# Altium footprint library PTH-Footprint.PcbLib: 58 footprints (part 4 of 4)
Each footprint in its own frame and in the unit in brackets; x right, y up, seen from the top. Pads: shape width x height; smd on the part's side, far side on the other; paste and mask are expansions set on the pad; w line width, h text height; cw(c..) or ccw(c..) is an arc to the next point about the centre after c.
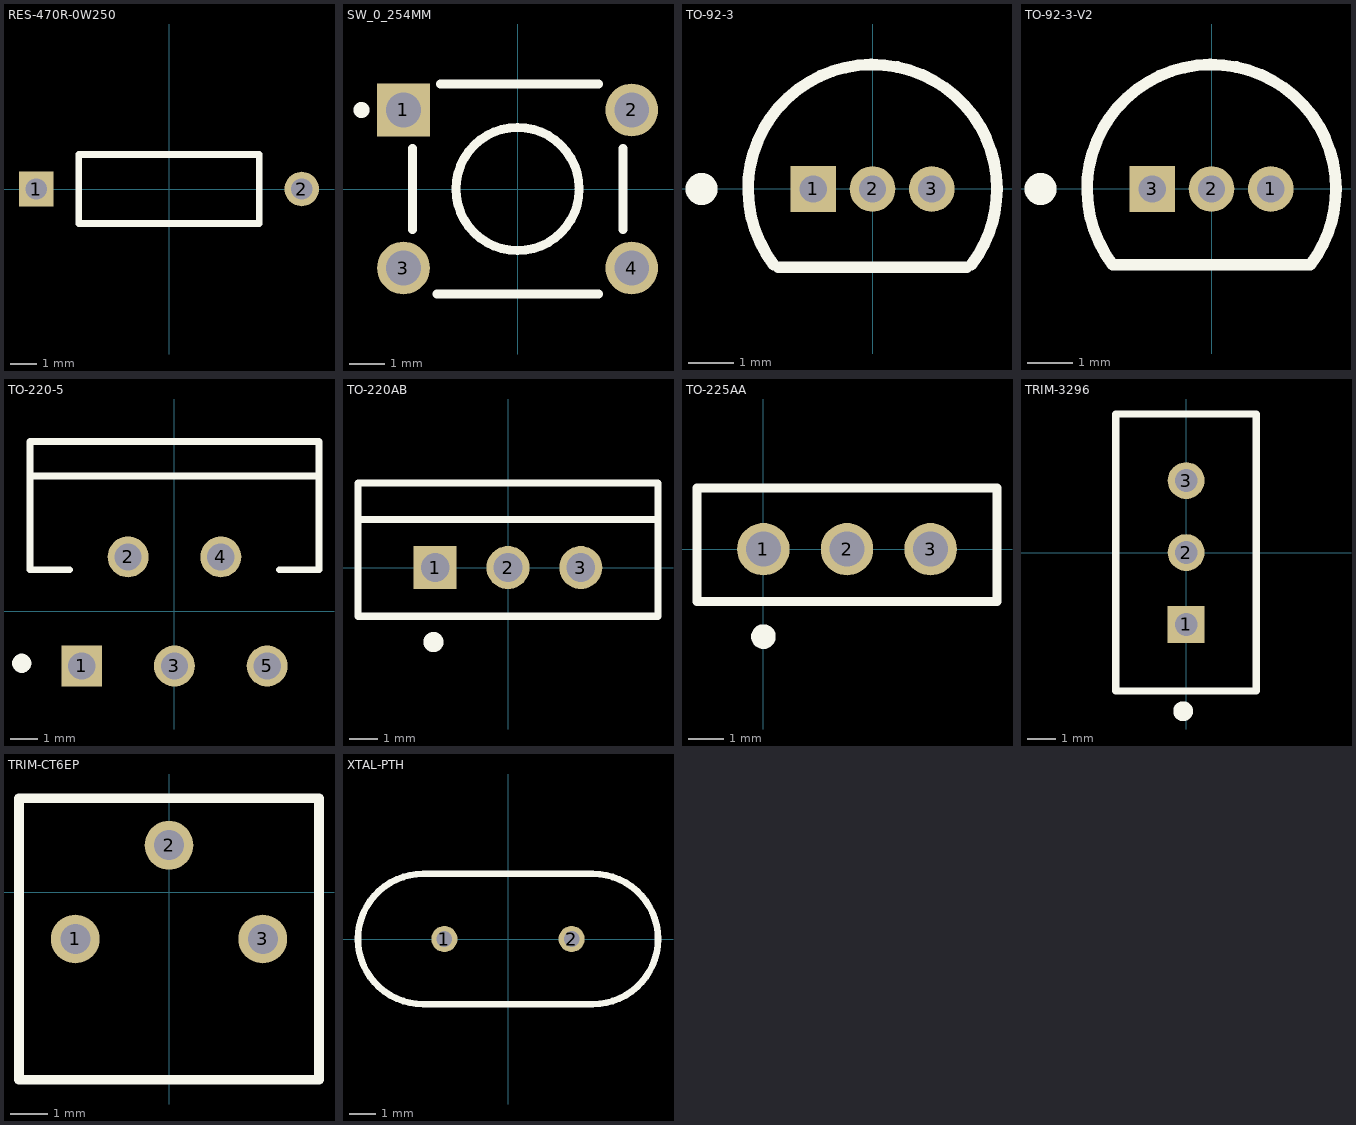
[diagram p3: the footprints below, top view; thin cyan lines are the x and y axes]

## RES-470R-0W250 [mm]
pads (2):
  rect 1.3x1.3 hole 0.8 paste-2539.97 mask+0: 1(-5,0)
  round 1.3 hole 0.8 paste-2539.97 mask+0: 2(5,0)
Top Overlay:
  lines w0.254: -3.4,-1.3 -3.4,1.3 3.4,1.3 3.4,-1.3 -3.4,-1.3
Top 3D Body (Mech5):
  lines w0.2: -3.4,-1.3 -3.4,1.3 3.4,1.3 3.4,-1.3 -3.4,-1.3
3D body "470R.STEP": height 3.1, standoff -1.3, extent -5.303,-1.201 5.357,1.201

## SW_0_254MM [mm]
pads (4):
  rect 1.498x1.498 / inner round 1.498 / far side rect 1.498x1.498 hole 0.99: 1(-3.25,2.25)
  round 1.498 hole 0.99: 2(3.25,2.25) 3(-3.25,-2.25) 4(3.25,-2.25)
Top Overlay:
  circle w0.254: c0,0 r1.755
  circle w0.254: c-4.445,2.25 r0.1
  lines w0.254: -2.995,-1.15 -2.995,1.15 ; -2.3,-2.995 2.3,-2.995 ; -2.2,2.995 2.3,2.995 ; 3,-1.15 3,1.15
3D body "step_temp.STEP": height 5.01, standoff -3.51, extent -3.898,-2.995 3.9,2.995

## TO-92-3 [mm]
pads (3):
  rect 1x1 hole 0.6 paste-2539.97 mask+0: 1(-1.3,0)
  round 1 hole 0.6 paste-2539.97 mask+0: 2(0,0) 3(1.3,0)
Top Overlay:
  circle w0.5: c-3.75,0 r0.1
  lines w0.254: -2.164,-1.665 cw(c0,0) 2.73,0 cw(c0,0) 2.164,-1.665 ; -2.064,-1.714 2.064,-1.714
3D body "PN2222ABU.step": height 10.33, standoff -10.62, extent -2.371,-1.41 2.371,2.21

## TO-92-3-V2 [mm]
pads (3):
  round 1 hole 0.6 paste-2539.97 mask+0: 1(1.3,0) 2(0,0)
  rect 1x1 hole 0.6 paste-2539.97 mask+0: 3(-1.3,0)
Top Overlay:
  circle w0.5: c-3.75,0 r0.1
  lines w0.254: -2.164,-1.665 cw(c0,0) 2.73,0 cw(c0,0) 2.164,-1.665 -2.164,-1.665
3D body "PN2222ABU.step": height 10.33, standoff -10.62, extent -2.371,-1.41 2.371,2.21

## TO-220-5 [mm] "FM, 5-Leads, Body 10.6x4.7mm, Pitch 1.7mm"
height 21.1
pads (5):
  rect 1.5x1.5 hole 1: 1(-3.4,-2)
  round 1.5 hole 1: 2(-1.7,2) 3(0,-2) 4(1.7,2) 5(3.4,-2)
Top Overlay:
  circle w0.5: c-5.6,-1.9 r0.1
  lines w0.254: -5.3,4.96 5.3,4.96 ; -3.854,1.53 -5.3,1.53 -5.3,6.23 5.3,6.23 5.3,1.53 3.854,1.53
3D body "LM2596T-5.0.step": height 20.93, standoff -3.78, extent -5.08,-2.214 5.08,6.257

## TO-220AB [mm]
pads (3):
  rect 1.5x1.5 hole 1 paste-2539.97 mask+0: 1(-2.54,0)
  round 1.5 hole 1 paste-2539.97 mask+0: 2(0,0) 3(2.54,0)
Top Overlay:
  circle w0.5: c-2.6,-2.6 r0.1
  lines w0.254: -5.105,1.676 5.105,1.676 ; -5.232,-1.702 -5.232,2.946 5.232,2.946 5.232,-1.702 -5.232,-1.702
3D body "IRF4905PBF.step": height 20.3, standoff -9.03, extent -5.207,-1.422 5.207,3.023

## TO-225AA [mm]
pads (3):
  round 1.5 hole 1 paste-2539.97 mask+0: 1(0,0) 2(2.388,0) 3(4.775,0)
Top Overlay:
  circle w0.5: c0,-2.5 r0.1
  lines w0.254: -1.9,-1.5 6.675,-1.5 6.675,1.75 -1.9,1.75 -1.9,-1.5
3D body "TO-225AA.stp": height 18.97, standoff -6.96, extent -1.802,-1.39 6.578,1.65

## TRIM-3296 [mm]
pads (3):
  rect 1.3x1.3 hole 0.8 paste-2539.97 mask+0: 1(0.005,-2.54)
  round 1.3 hole 0.8 paste-2539.97 mask+0: 2(0.005,0) 3(0.005,2.54)
Top Overlay:
  circle w0.5: c-0.1,-5.6 r0.1
  lines w0.254: -2.48,-4.89 2.48,-4.89 2.48,4.89 -2.48,4.89 -2.48,-4.89
Top 3D Body (Mech5):
  lines w0.2: -2.48,-4.89 2.48,-4.89 2.48,4.89 -2.48,4.89 -2.48,-4.89
3D body "3296W-V.stp": height 11.5, standoff -2.7, extent -2.4,-4.75 2.4,4.75

## TRIM-CT6EP [mm]
pads (3):
  round 1.3 hole 0.8: 1(-2.5,-1.25) 2(0,1.25) 3(2.5,-1.25)
Top Overlay:
  lines w0.254: -4,-5 4,-5 4,2.5 -4,2.5 -4,-5
3D body "CT-6EP1k_(102).stp": height 6, standoff -6.8, extent -3.5,-4.8 3.5,2.2

## XTAL-PTH [mm]
pads (2):
  round 1 hole 0.6: 1(-2.44,0) 2(2.44,0)
Top Overlay:
  lines w0.254: -5.75,0 cw(c-3.25,0) -3.25,2.5 3.25,2.5 cw(c3.25,0) 5.75,0 cw(c3.25,0) 3.25,-2.5 -3.25,-2.5 cw(c-3.25,0) -5.75,0
3D body "KX-3H-PRATA.STEP": height 3.6, standoff -4.7, extent -5.675,-2.325 5.675,2.325